# Altium footprint library CAP_TH.PcbLib: 220 footprints (part 6 of 14)
Each footprint in its own frame and in the unit in brackets; x right, y up, seen from the top. Pads: shape width x height; smd on the part's side, far side on the other; paste and mask are expansions set on the pad; w line width, h text height; cw(c..) or ccw(c..) is an arc to the next point about the centre after c.
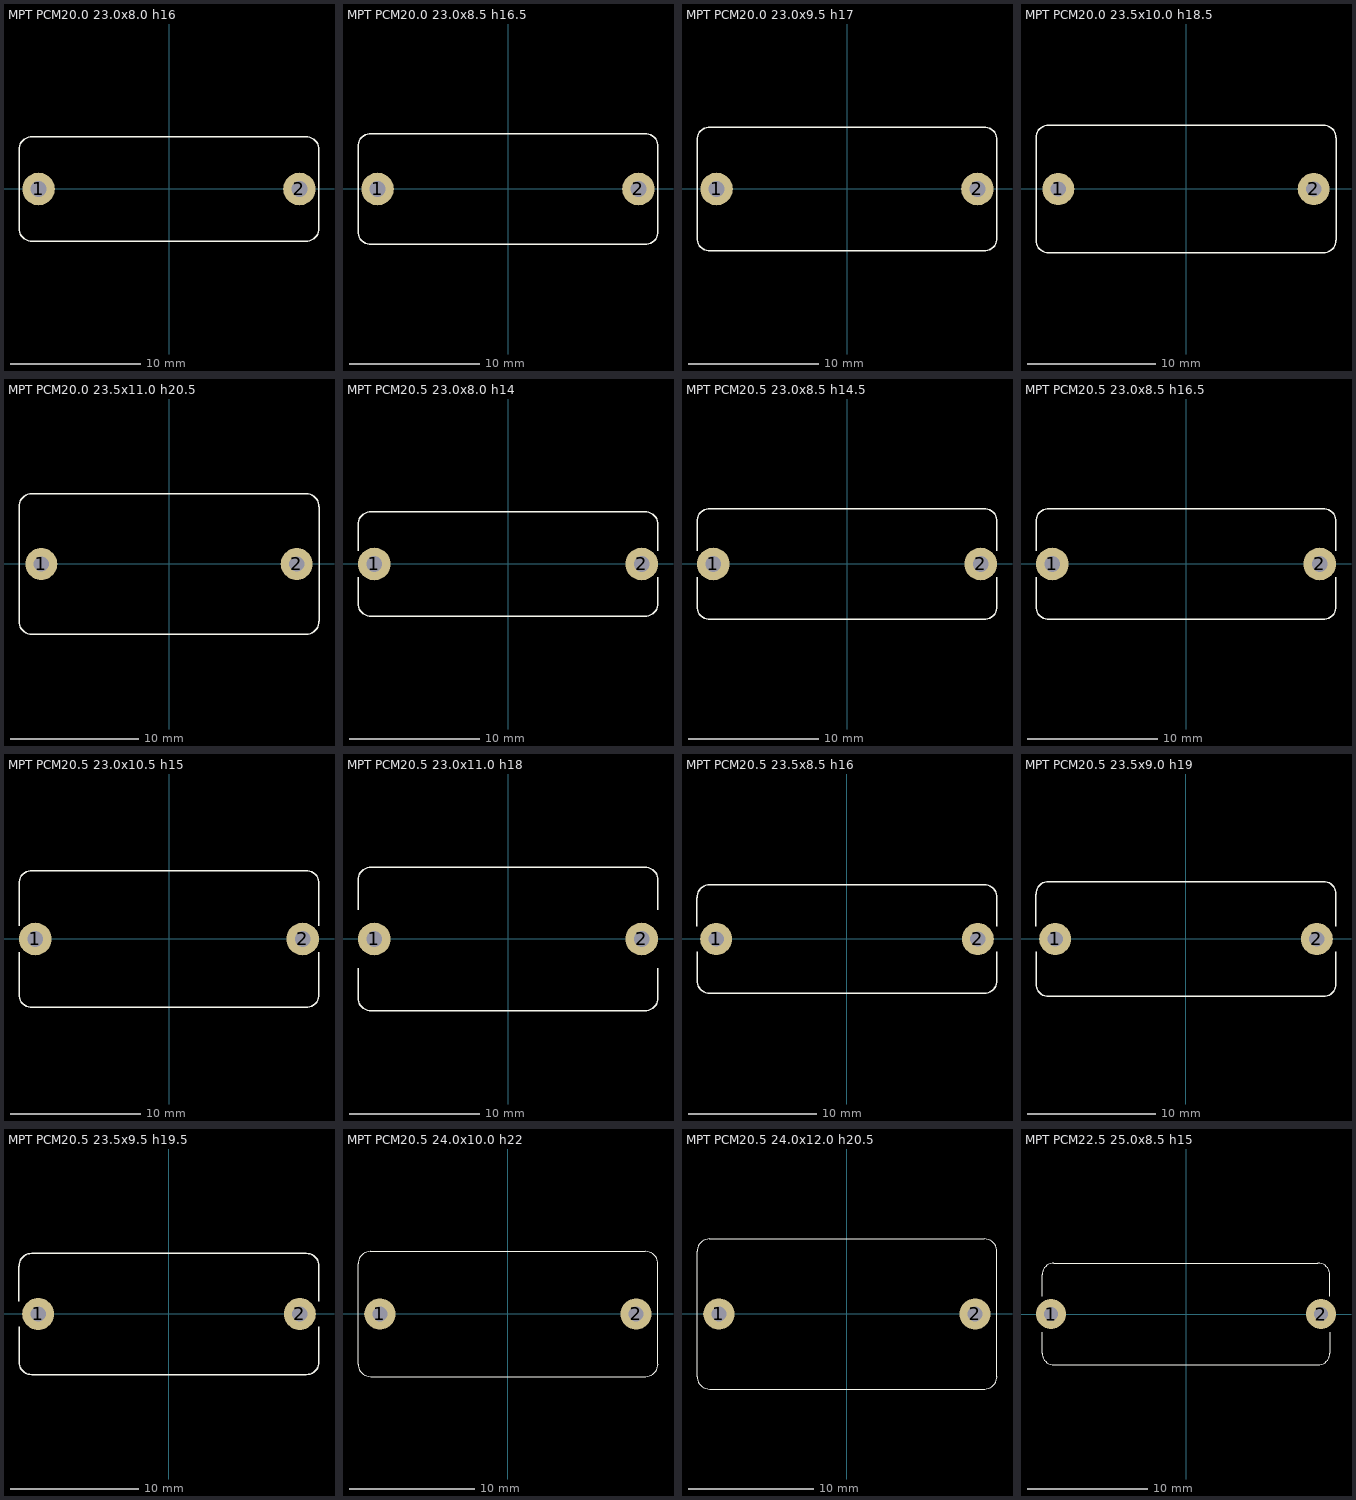
[diagram p5: the footprints below, top view; thin cyan lines are the x and y axes]

## MPT PCM20.0 23.0x8.0 h16 [mm]
pads (2):
  round 2.5 hole 1.2: 1(-10,0) 2(10,0)
Top Overlay:
  lines w0.1: -11.5,-3 ccw(c-10.5,-3) -10.5,-4 10.5,-4 ccw(c10.5,-3) 11.5,-3 11.5,3 ccw(c10.5,3) 10.5,4 -10.5,4 ccw(c-10.5,3) -11.5,3 -11.5,-3
3D body "MPT PCM20.0 23.0x8.0 h16.STEP": height 18, standoff -2, extent -11.5,-4 11.5,4

## MPT PCM20.0 23.0x8.5 h16.5 [mm]
pads (2):
  round 2.5 hole 1.2: 1(-10,0) 2(10,0)
Top Overlay:
  lines w0.1: -11.5,-3.25 ccw(c-10.5,-3.25) -10.5,-4.25 10.5,-4.25 ccw(c10.5,-3.25) 11.5,-3.25 11.5,3.25 ccw(c10.5,3.25) 10.5,4.25 -10.5,4.25 ccw(c-10.5,3.25) -11.5,3.25 -11.5,-3.25
3D body "MPT PCM20.0 23.0x8.5 h16.5.STEP": height 18.5, standoff -2, extent -11.5,-4.25 11.5,4.25

## MPT PCM20.0 23.0x9.5 h17 [mm]
pads (2):
  round 2.5 hole 1.2: 1(-10,0) 2(10,0)
Top Overlay:
  lines w0.1: -11.5,-3.75 ccw(c-10.5,-3.75) -10.5,-4.75 10.5,-4.75 ccw(c10.5,-3.75) 11.5,-3.75 11.5,3.75 ccw(c10.5,3.75) 10.5,4.75 -10.5,4.75 ccw(c-10.5,3.75) -11.5,3.75 -11.5,-3.75
3D body "MPT PCM20.0 23.0x9.5 h17.STEP": height 19, standoff -2, extent -11.5,-4.75 11.5,4.75

## MPT PCM20.0 23.5x10.0 h18.5 [mm]
pads (2):
  round 2.5 hole 1.2: 1(-10,0) 2(10,0)
Top Overlay:
  lines w0.1: -11.75,-4 ccw(c-10.75,-4) -10.75,-5 10.75,-5 ccw(c10.75,-4) 11.75,-4 11.75,4 ccw(c10.75,4) 10.75,5 -10.75,5 ccw(c-10.75,4) -11.75,4 -11.75,-4
3D body "MPT PCM20.0 23.5x10.0 h18.5.STEP": height 20.5, standoff -2, extent -11.75,-5 11.75,5

## MPT PCM20.0 23.5x11.0 h20.5 [mm]
pads (2):
  round 2.5 hole 1.2: 1(-10,0) 2(10,0)
Top Overlay:
  lines w0.1: -11.75,-4.5 ccw(c-10.75,-4.5) -10.75,-5.5 10.75,-5.5 ccw(c10.75,-4.5) 11.75,-4.5 11.75,4.5 ccw(c10.75,4.5) 10.75,5.5 -10.75,5.5 ccw(c-10.75,4.5) -11.75,4.5 -11.75,-4.5
3D body "MPT PCM20.0 23.5x11.0 h20.5.STEP": height 22.5, standoff -2, extent -11.75,-5.5 11.75,5.5

## MPT PCM20.5 23.0x8.0 h14 [mm]
pads (2):
  round 2.5 hole 1.2: 1(-10.25,0) 2(10.25,0)
Top Overlay:
  lines w0.1: -11.5,-1 -11.5,-3 ccw(c-10.5,-3) -10.5,-4 10.5,-4 ccw(c10.5,-3) 11.5,-3 11.5,-1 ; -11.5,1 -11.5,3 cw(c-10.5,3) -10.5,4 10.5,4 cw(c10.5,3) 11.5,3 11.5,1
3D body "MPT PCM20.5 23.0x8.0 h14.STEP": height 16, standoff -2, extent -11.5,-4 11.5,4

## MPT PCM20.5 23.0x8.5 h14.5 [mm]
pads (2):
  round 2.5 hole 1.2: 1(-10.25,0) 2(10.25,0)
Top Overlay:
  lines w0.1: -11.5,-1 -11.5,-3.25 ccw(c-10.5,-3.25) -10.5,-4.25 10.5,-4.25 ccw(c10.5,-3.25) 11.5,-3.25 11.5,-1 ; -11.5,1 -11.5,3.25 cw(c-10.5,3.25) -10.5,4.25 10.5,4.25 cw(c10.5,3.25) 11.5,3.25 11.5,1
3D body "MPT PCM20.5 23.0x8.5 h14.5.STEP": height 16.5, standoff -2, extent -11.5,-4.25 11.5,4.25

## MPT PCM20.5 23.0x8.5 h16.5 [mm]
pads (2):
  round 2.5 hole 1.2: 1(-10.25,0) 2(10.25,0)
Top Overlay:
  lines w0.1: -11.5,-1 -11.5,-3.25 ccw(c-10.5,-3.25) -10.5,-4.25 10.5,-4.25 ccw(c10.5,-3.25) 11.5,-3.25 11.5,-1 ; -11.5,1 -11.5,3.25 cw(c-10.5,3.25) -10.5,4.25 10.5,4.25 cw(c10.5,3.25) 11.5,3.25 11.5,1
3D body "MPT PCM20.5 23.0x8.5 h16.5.STEP": height 18.5, standoff -2, extent -11.5,-4.25 11.5,4.25

## MPT PCM20.5 23.0x10.5 h15 [mm]
pads (2):
  round 2.5 hole 1.2: 1(-10.25,0) 2(10.25,0)
Top Overlay:
  lines w0.1: -11.5,-1 -11.5,-4.25 ccw(c-10.5,-4.25) -10.5,-5.25 10.5,-5.25 ccw(c10.5,-4.25) 11.5,-4.25 11.5,-1 ; -11.5,1 -11.5,4.25 cw(c-10.5,4.25) -10.5,5.25 10.5,5.25 cw(c10.5,4.25) 11.5,4.25 11.5,1
3D body "MPT PCM20.5 23.0x10.5 h15.STEP": height 17, standoff -2, extent -11.5,-5.25 11.5,5.25

## MPT PCM20.5 23.0x11.0 h18 [mm]
pads (2):
  round 2.5 hole 1.2: 1(-10.25,0) 2(10.25,0)
Top Overlay:
  lines w0.1: -11.5,-2.25 -11.5,-4.5 ccw(c-10.5,-4.5) -10.5,-5.5 10.5,-5.5 ccw(c10.5,-4.5) 11.5,-4.5 11.5,-2.25 ; -11.5,2.25 -11.5,4.5 cw(c-10.5,4.5) -10.5,5.5 10.5,5.5 cw(c10.5,4.5) 11.5,4.5 11.5,2.25
3D body "MPT PCM20.5 23.0x11.0 h18.STEP": height 20, standoff -2, extent -11.5,-5.5 11.5,5.5

## MPT PCM20.5 23.5x8.5 h16 [mm]
pads (2):
  round 2.5 hole 1.2: 1(-10.25,0) 2(10.25,0)
Top Overlay:
  lines w0.1: -11.75,-1 -11.75,-3.25 ccw(c-10.75,-3.25) -10.75,-4.25 10.75,-4.25 ccw(c10.75,-3.25) 11.75,-3.25 11.75,-1 ; -11.75,1 -11.75,3.25 cw(c-10.75,3.25) -10.75,4.25 10.75,4.25 cw(c10.75,3.25) 11.75,3.25 11.75,1
3D body "MPT PCM20.5 23.5x8.5 h16.STEP": height 18, standoff -2, extent -11.75,-4.25 11.75,4.25

## MPT PCM20.5 23.5x9.0 h19 [mm]
pads (2):
  round 2.5 hole 1.2: 1(-10.25,0) 2(10.25,0)
Top Overlay:
  lines w0.1: -11.75,-1 -11.75,-3.5 ccw(c-10.75,-3.5) -10.75,-4.5 ; -11.75,1 -11.75,3.5 cw(c-10.75,3.5) -10.75,4.5 10.75,4.5 cw(c10.75,3.5) 11.75,3.5 11.75,1 ; -10.75,-4.5 10.75,-4.5 ccw(c10.75,-3.5) 11.75,-3.5 11.75,-1
3D body "MPT PCM20.5 23.5x9.0 h19.STEP": height 21, standoff -2, extent -11.75,-4.5 11.75,4.5

## MPT PCM20.5 23.5x9.5 h19.5 [mm]
pads (2):
  round 2.5 hole 1.2: 1(-10.25,0) 2(10.25,0)
Top Overlay:
  lines w0.1: -11.75,-1 -11.75,-3.75 ccw(c-10.75,-3.75) -10.75,-4.75 10.75,-4.75 ccw(c10.75,-3.75) 11.75,-3.75 11.75,-1 ; -11.75,1 -11.75,3.75 cw(c-10.75,3.75) -10.75,4.75 10.75,4.75 cw(c10.75,3.75) 11.75,3.75 11.75,1
3D body "MPT PCM20.5 23.5x9.5 h19.5.STEP": height 21.5, standoff -2, extent -11.75,-4.75 11.75,4.75

## MPT PCM20.5 24.0x10.0 h22 [mm]
pads (2):
  round 2.5 hole 1.2: 1(-10.25,0) 2(10.25,0)
Top Overlay:
  lines w0.1: -12,-4 ccw(c-11,-4) -11,-5 11,-5 ccw(c11,-4) 12,-4 12,4 ccw(c11,4) 11,5 -11,5 ccw(c-11,4) -12,4 -12,-4
3D body "MPT PCM20.5 24.0x10.0 h22.STEP": height 24, standoff -2, extent -12,-5 12,5

## MPT PCM20.5 24.0x12.0 h20.5 [mm]
pads (2):
  round 2.5 hole 1.2: 1(-10.25,0) 2(10.25,0)
Top Overlay:
  lines w0.1: -12,-5 ccw(c-11,-5) -11,-6 11,-6 ccw(c11,-5) 12,-5 12,5 ccw(c11,5) 11,6 -11,6 ccw(c-11,5) -12,5 -12,-5
3D body "MPT PCM20.5 24.0x12.0 h20.5.STEP": height 22.5, standoff -2, extent -12,-6 12,6

## MPT PCM22.5 25.0x8.5 h15 [mm]
pads (2):
  round 2.5 hole 1.2: 1(-11.25,0) 2(11.25,0)
Top Overlay:
  lines w0.1: -12,-1.5 -12,-3.25 ccw(c-11,-3.25) -11,-4.25 11,-4.25 ccw(c11,-3.25) 12,-3.25 12,-1.5 ; -12,1.5 -12,3.25 cw(c-11,3.25) -11,4.25 11,4.25 cw(c11,3.25) 12,3.25 12,1.5
3D body "MPT PCM22.5 25.0x8.5 h15.STEP": height 17, standoff -2, extent -12,-4.25 12,4.25